# Altium footprint library SENSOR.PcbLib: 76 footprints (part 5 of 5)
Each footprint in its own frame and in the unit in brackets; x right, y up, seen from the top. Pads: shape width x height; smd on the part's side, far side on the other; paste and mask are expansions set on the pad; w line width, h text height; cw(c..) or ccw(c..) is an arc to the next point about the centre after c.
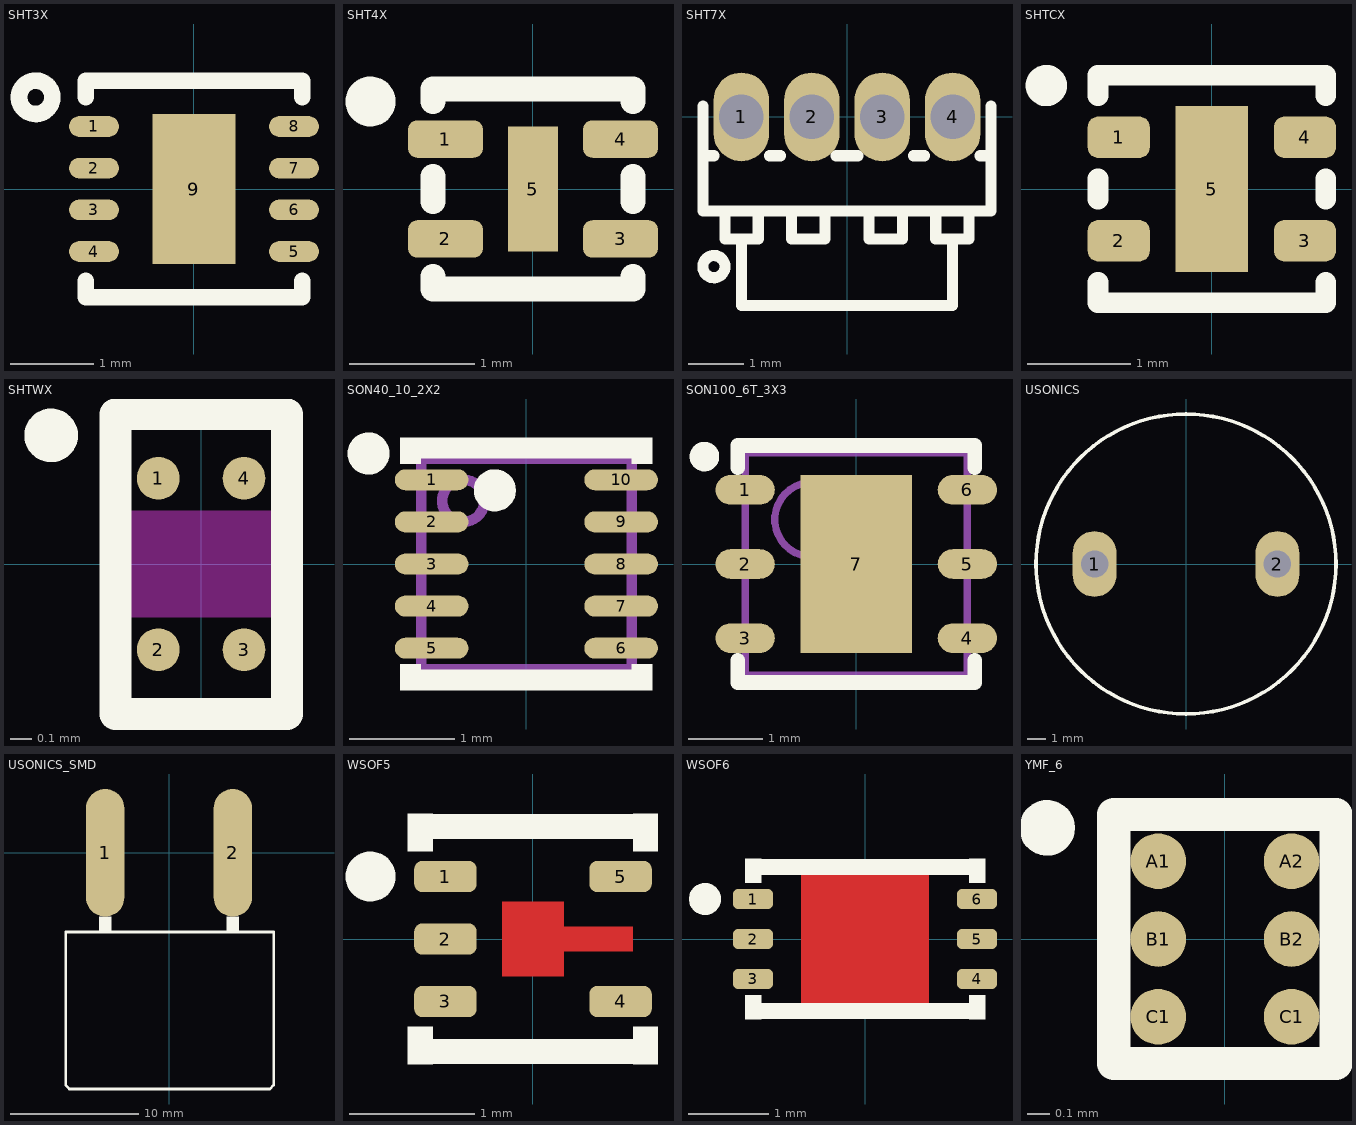
[diagram p4: the footprints below, top view; thin cyan lines are the x and y axes]

## SHT3X [mm] "SENSIRION SHT3x humidity and temp sensor 2.5x2.5x1mm"
height 1
pads (9):
  oval 0.6x0.25 smd paste-0.025 mask+0.075: 1(-1.2,0.75) 2(-1.2,0.25) 3(-1.2,-0.25) 4(-1.2,-0.75) 5(1.2,-0.75) 6(1.2,-0.25) 7(1.2,0.25) 8(1.2,0.75)
  rect 1x1.8 smd: 9(0,0)
Top Overlay:
  circle w0.2: c-1.9,1.1 r0.2
  lines w0.2: -1.3,-1.1 -1.3,-1.3 1.3,-1.3 1.3,-1.1 ; -1.3,1.1 -1.3,1.3 1.3,1.3 1.3,1.1
3D body "sht3x.step": height 0.9, standoff 0, extent -1.25,-1.3 1.25,1.2

## SHT4X [mm] "SENSIRION SHT4X humidity and temp sensor 1.5X1.5x0.54mm"
height 0.6
pads (5):
  rrect50% 0.6x0.3 smd paste-0.025 mask+0.075: 1(-0.7,0.4) 2(-0.7,-0.4) 3(0.7,-0.4) 4(0.7,0.4)
  rect 0.4x1 smd mask+0.075: 5(0,0)
Top Overlay:
  circle w0.2: c-1.3,0.7 r0.1
  lines w0.2: -0.8,-0.7 -0.8,-0.8 0.8,-0.8 0.8,-0.7 ; -0.8,-0.1 -0.8,0.1 ; -0.8,0.7 -0.8,0.8 0.8,0.8 0.8,0.7 ; 0.8,-0.1 0.8,0.1
3D body "SHT4x.step": height 0.55, standoff 0, extent -0.751,-0.75 0.751,0.75

## SHT7X [mm] "SENSIRION SHT7x humidity and temp sensor"
pads (4):
  oval 1x1.6 hole 0.8 mask+0.075: 1(-1.905,0) 2(-0.635,0)
  oval 1x1.6 hole 0.8 paste+0 mask+0.075: 3(0.635,0) 4(1.905,0)
Top Overlay:
  circle w0.2: c-2.4,-2.7 r0.2
  lines w0.2: -2.6,-0.7 -2.4,-0.7 ; -2.6,0.2 -2.6,-1.7 2.6,-1.7 2.6,0.2 ; -2.2,-1.7 -2.2,-2.2 -1.6,-2.2 -1.6,-1.7 ; -1.9,-2.2 -1.9,-3.4 1.9,-3.4 1.9,-2.2 ; -1.4,-0.7 -1.2,-0.7 ; -1,-1.7 -1,-2.2 -0.4,-2.2 -0.4,-1.7 ; -0.2,-0.7 0.2,-0.7 ; 0.4,-1.7 0.4,-2.2 1,-2.2 1,-1.7 ; 1.2,-0.7 1.4,-0.7 ; 1.6,-1.7 1.6,-2.2 2.2,-2.2 2.2,-1.7 ; 2.4,-0.7 2.6,-0.7
3D body "SHT7x.STEP": height 13.7, standoff -6.1, extent -2.54,-3.3 2.54,0.1

## SHTCX [mm] "SENSIRION SHTCx humidity and temp sensor 2X2x0.75mm"
height 0.75
pads (5):
  rrect50% 0.6x0.4 smd paste-0.025 mask+0.075: 1(-0.9,0.5) 2(-0.9,-0.5) 3(0.9,-0.5) 4(0.9,0.5)
  rect 0.7x1.6 smd mask+0.075: 5(0,0)
Top Overlay:
  circle w0.2: c-1.6,1 r0.1
  lines w0.2: -1.1,-0.9 -1.1,-1.1 1.1,-1.1 1.1,-0.9 ; -1.1,-0.1 -1.1,0.1 ; -1.1,0.9 -1.1,1.1 1.1,1.1 1.1,0.9 ; 1.1,-0.1 1.1,0.1
3D body "shtc1.step": height 0.76, standoff -0.01, extent -1.01,-1 1.01,1

## SHTWX [mm] "SENSIRION SHTW2 humidity and temp sensor 0.7X1.3x0.5mm"
height 0.5
pads (8):
  round 0.2 smd paste-0.15 mask+0.05: 1(-0.2,0.4) 2(-0.2,-0.4) 3(0.2,-0.4) 4(0.2,0.4)
  rrect30% 0.25x0.25 on Top Paste: ""(-0.2,-0.4) ""(-0.2,0.4) ""(0.2,-0.4) ""(0.2,0.4)
Top Layer keep-out:
  rectangle: -0.45,-0.25 0.45,0.25
Top Overlay:
  circle w0.15: c-0.7,0.6 r0.05
  lines w0.15: -0.4,-0.7 0.4,-0.7 0.4,0.7 -0.4,0.7 -0.4,-0.7
3D body "115093-01_Publikationsmodell SHTW2.step": height 0.54, standoff -0.01, extent -0.37,-0.655 0.37,0.655

## SON40_10_2X2 [mm] "DFN-10 pitch:2mm 2X2X0.85mm"
height 0.9
pads (10):
  oval 0.7x0.2 smd mask+0.05: 1(-0.9,0.8) 2(-0.9,0.4) 3(-0.9,0) 4(-0.9,-0.4) 5(-0.9,-0.8) 6(0.9,-0.8) 7(0.9,-0.4) 8(0.9,0) 9(0.9,0.4) 10(0.9,0.8)
Top Overlay:
  circle w0.2: c-1.5,1.05 r0.1
  circle w0.2: c-0.3,0.7 r0.1
  region: 1.2,-0.95 1,-0.95 1,-1.2 1.2,-1.2
  rectangle: -1.2,-1.2 -1,-0.95
  rectangle: -1.2,0.95 -1,1.2
  region: 1.2,1.2 1,1.2 1,0.95 1.2,0.95
  lines w0.2: -1.1,-1.1 1.1,-1.1 ; -1.1,1.1 1.1,1.1
Mechanical 13:
  circle w0.1: c-0.6,0.6 r0.2
  lines w0.1: -1,-1 -1,1 1,1 1,-1 -1,-1
3D body "User Library-DFN-10 (2x2) 0_4 pitch.step": height 0.85, standoff -0.03, extent -1.01,-1 1.01,1

## SON100_6T_3X3 [mm] "SON, 6-Leads, Body 3x3mm, Pitch 1.00mm, STS21"
height 1.1
pads (7):
  oval 0.8x0.4 smd mask+0.075: 1(-1.5,1) 2(-1.5,0) 3(-1.5,-1) 4(1.5,-1) 5(1.5,0) 6(1.5,1)
  rect 1.5x2.4 smd paste-5: 7(0,0)
Top Overlay:
  circle w0.2: c-2.05,1.45 r0.1
  lines w0.2: -1.6,-1.3 -1.6,-1.6 1.6,-1.6 1.6,-1.3 ; -1.6,1.3 -1.6,1.6 1.6,1.6 1.6,1.3
Top Paste:
  rectangle: -0.6,-1 0.6,-0.2
  rectangle: -0.6,0.2 0.6,1
Mechanical 13:
  circle w0.1: c-0.6,0.6 r0.5
  lines w0.1: -1.5,-1.5 1.5,-1.5 1.5,1.5 -1.5,1.5 -1.5,-1.5
3D body "Sensirion_Humidity_SHT2x-STEP-file.STEP": height 1.1, standoff 0, extent -1.5,-1.5 1.5,1.5

## USONICS [mm] "ULTRASONIC 400PT160"
height 1.27
pads (2):
  oval 2.4x3.6 hole 1.5: 1(-5,0) 2(5,0)
Top Overlay:
  circle w0.2: c0,0 r8.2
3D body "User Library-400PT160.STEP": height 12.1, standoff -9.9, extent -8.1,-8.1 8.1,8.1

## USONICS_SMD [mm] "ULTRASONIC 400PT160"
height 1.27
pads (2):
  oval 3x10 smd: 1(-5,0) 2(5,0)
Top Overlay:
  rectangle: -5.5,-6.2 -4.5,-5
  rectangle: 4.5,-6.2 5.5,-5
  lines w0.2: -8.1,-18.2 -8.1,-6.2 8.2,-6.2 8.2,-18.2 7.9,-18.5 -7.8,-18.5 -8.1,-18.2
3D body "User Library-400PT160.STEP": height 8.6, standoff -7.6, extent -8.05,-18.4 8.15,3.6

## WSOF5 [mm] "ROHM light sensor, 1.6x1.6x0.6mm, 0.5mm pitch"
height 0.6
pads (5):
  rrect50% 0.5x0.25 smd paste-0.025 mask+0.05: 1(-0.7,0.5) 2(-0.7,0) 3(-0.7,-0.5) 4(0.7,-0.5) 5(0.7,0.5)
Top Layer:
  rectangle: -0.25,-0.3 0.25,0.3
  rectangle: 0,-0.1 0.8,0.1
Top Overlay:
  circle w0.2: c-1.3,0.5 r0.1
  region: -1,0.7 -0.8,0.7 -0.8,1 -1,1
  region: 1,0.7 0.8,0.7 0.8,1 1,1
  region: 1,-0.7 0.8,-0.7 0.8,-1 1,-1
  region: -1,-0.7 -0.8,-0.7 -0.8,-1 -1,-1
  lines w0.2: -0.9,-0.9 0.9,-0.9 ; -0.9,0.9 0.9,0.9
3D body "WSOF5.step": height 0.6, standoff 0, extent -0.8,-0.8 0.8,0.8

## WSOF6 [mm] "ROHM light sensor, 1.6x3x0.75mm, 0.5mm pitch"
height 0.75
pads (6):
  rrect50% 0.5x0.25 smd paste-0.025 mask+0.05: 1(-1.4,0.5) 2(-1.4,0) 3(-1.4,-0.5) 4(1.4,-0.5) 5(1.4,0) 6(1.4,0.5)
Top Layer:
  rectangle: -0.8,-0.8 0.8,0.8
Top Overlay:
  circle w0.2: c-2,0.5 r0.1
  region: -1.5,0.7 -1.3,0.7 -1.3,1 -1.5,1
  region: 1.5,0.7 1.3,0.7 1.3,1 1.5,1
  region: 1.5,-0.7 1.3,-0.7 1.3,-1 1.5,-1
  region: -1.5,-0.7 -1.3,-0.7 -1.3,-1 -1.5,-1
  lines w0.2: -1.4,-0.9 1.4,-0.9 ; -1.4,0.9 1.4,0.9
3D body "WSOF6I.STEP": height 0.75, standoff -0.02, extent -1.5,-0.81 1.5,0.81

## YMF_6 [mm] "YMF0006A PicoStar, 0.85x0.95x0.22mm, 0.35mm pitch"
height 0.22
pads (6):
  round 0.25 smd mask-0.05: A1(-0.3,0.35) A2(0.3,0.35) B1(-0.3,0) B2(0.3,0) C1(-0.3,-0.35) C1(0.3,-0.35)
Top Overlay:
  circle w0.15: c-0.8,0.5 r0.05
  lines w0.15: -0.5,-0.56 0.5,-0.56 0.5,0.56 -0.5,0.56 -0.5,-0.56
3D body: height 0.22, standoff 0.01, extent -0.425,-0.475 0.425,0.475